# Altium footprint library ADP_SMT.PcbLib: 204 footprints (part 15 of 15)
Each footprint in its own frame and in the unit in brackets; x right, y up, seen from the top. Pads: shape width x height; smd on the part's side, far side on the other; paste and mask are expansions set on the pad; w line width, h text height; cw(c..) or ccw(c..) is an arc to the next point about the centre after c.
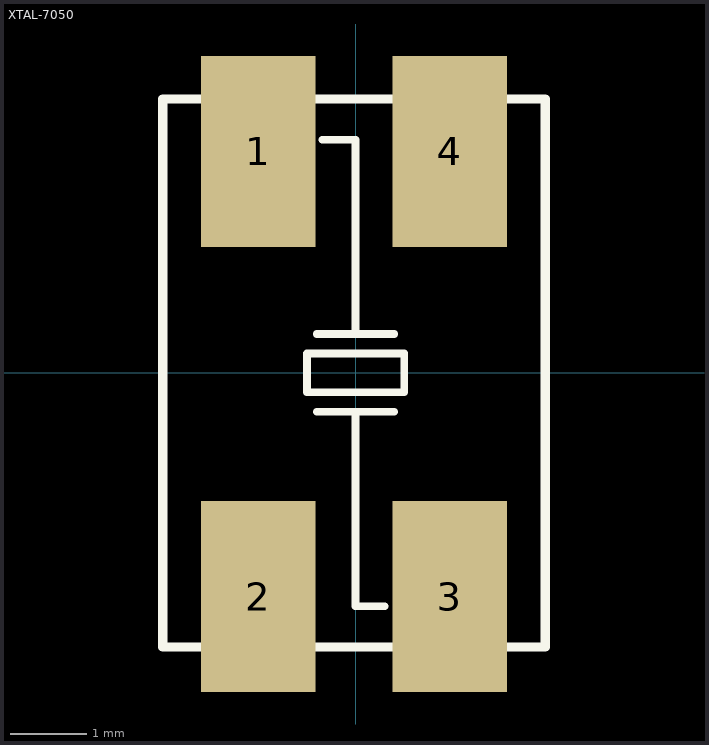
[diagram p14: the footprint, top view; thin cyan lines are the x and y axes]

## XTAL-7050 [mm]
pads (4):
  rect 1.5x2.5 smd: 1(-1.27,2.894) 2(-1.27,-2.922) 3(1.23,-2.922) 4(1.23,2.894)
Top Overlay:
  lines w0.1: -0.508,-0.508 0.508,-0.508 ; -0.508,0.508 0.508,0.508 ; -0.432,3.048 0,3.048 0,0.508 ; 0,-0.508 0,-3.048 0.381,-3.048 ; -0.635,-0.254 0.635,-0.254 0.635,0.254 -0.635,0.254 -0.635,-0.254
  lines w0.12: -2.52,-3.581 2.48,-3.581 2.48,3.581 -2.52,3.581 -2.52,-3.581
3D body "XTAL-7050.STEP": height 1, standoff 0, extent -2.5,-3.449 2.5,3.551